# Altium footprint library Active.PcbLib: 325 footprints (part 12 of 23)
Each footprint in its own frame and in the unit in brackets; x right, y up, seen from the top. Pads: shape width x height; smd on the part's side, far side on the other; paste and mask are expansions set on the pad; w line width, h text height; cw(c..) or ccw(c..) is an arc to the next point about the centre after c.
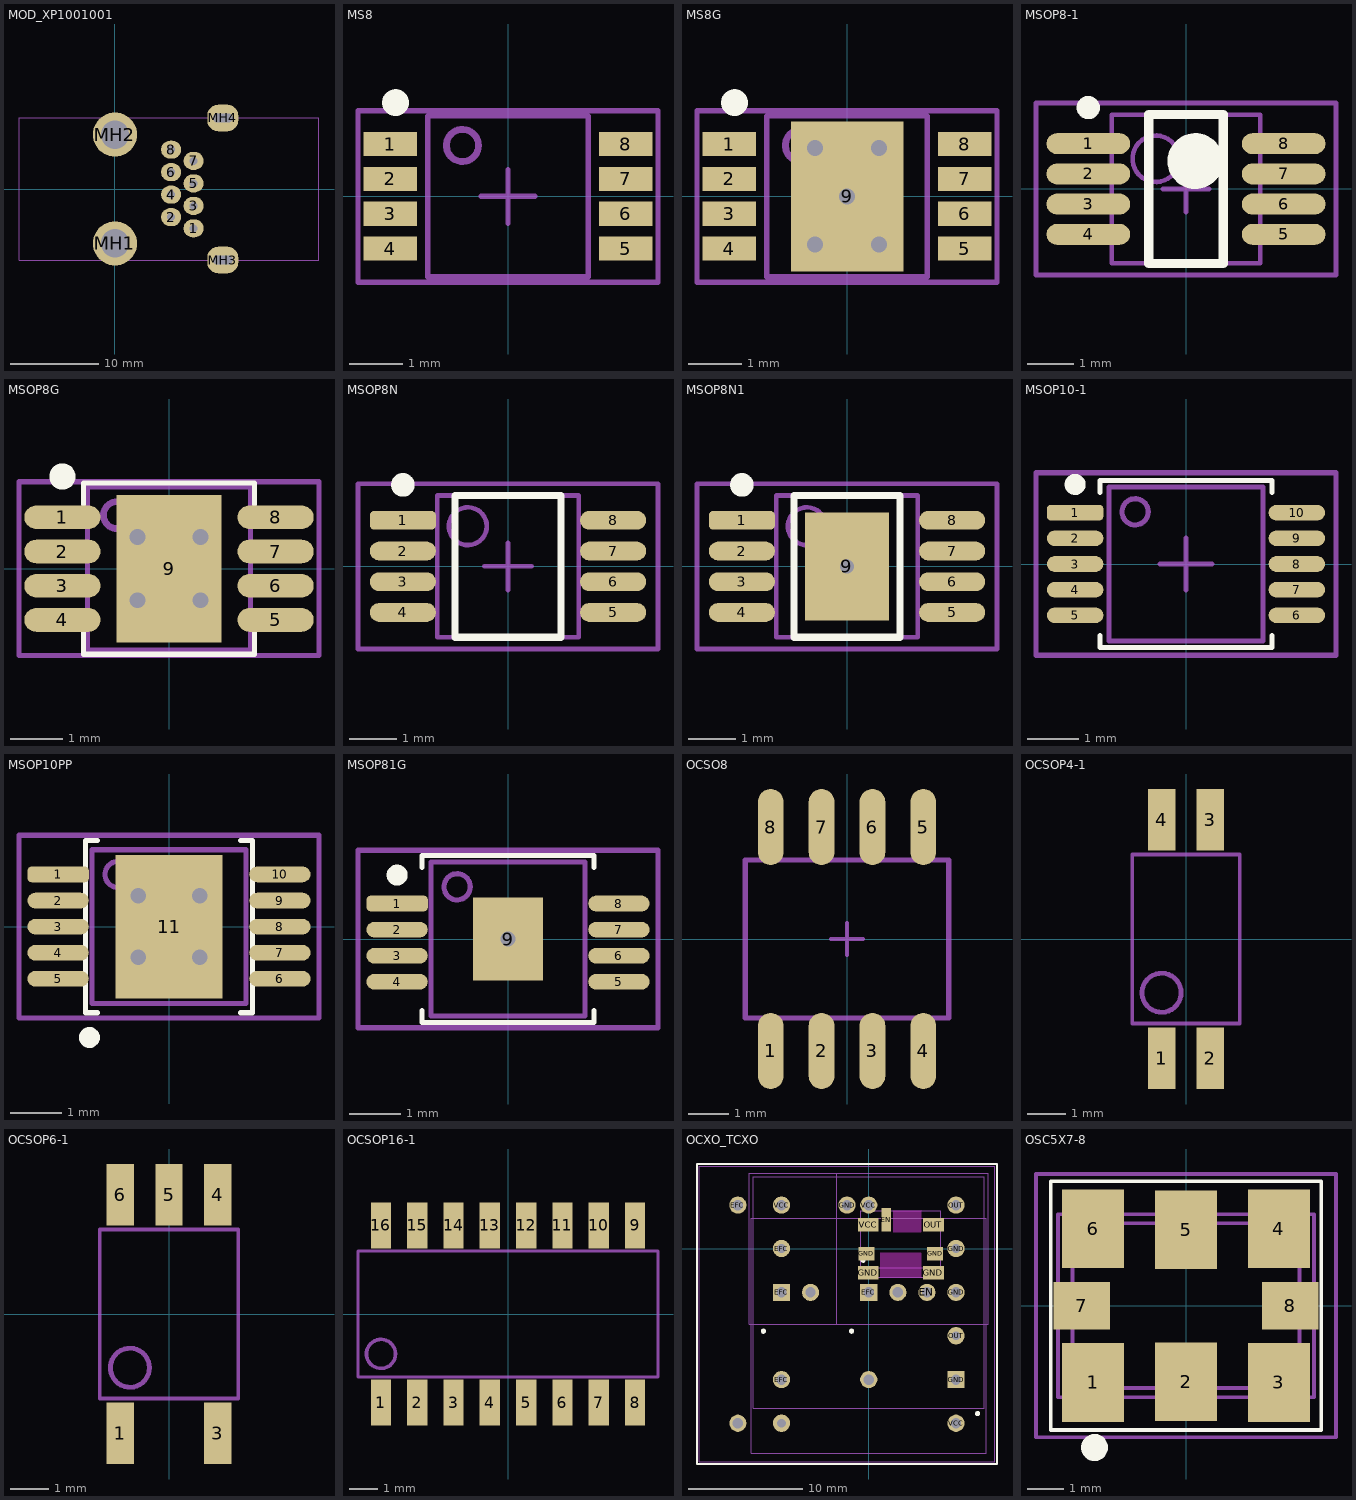
[diagram p11: the footprints below, top view; thin cyan lines are the x and y axes]

## MOD_XP1001001 [mil] "Ethernet controller module"
pads (12):
  oval 90x80 hole 35.43: 1(350,-175) 2(250,-125) 3(350,-75) 4(250,-25) 5(350,25) 6(250,75) 7(350,125) 8(250,175)
  round 196.85 hole 125.98: MH1(0,-242) MH2(0,242)
  rrect80% 137.8x118.11 hole 39.37 slot 86.61 at 0 deg: MH3(480,-316) MH4(480,316)
Mechanical 13:
  lines w4: -427,-316 -427,316 908,316 908,-316 -427,-316
3D body: height 644.43, standoff -152.87, extent -425.38,-421.29 956.02,415.33

## MS8 [mm] "MSOP 8pin 3,0x3,0mm R0,65mm High Density NO EP"
height 1.092
pads (8):
  rect 1x0.45 smd mask+0.051: 1(-2.2,0.975) 2(-2.2,0.325) 3(-2.2,-0.325) 4(-2.2,-0.975) 5(2.2,-0.975) 6(2.2,-0.325) 7(2.2,0.325) 8(2.2,0.975)
Top Overlay:
  circle w0.25: c-2.1,1.75 r0.125
Mechanical 13:
  circle w0.127: c-0.85,0.95 r0.3
  lines w0.1: -1.5,-1.5 1.5,-1.5 1.5,1.5 -1.5,1.5 -1.5,-1.5
Mechanical 15:
  lines w0.1: -0.5,0 0.5,0 ; 0,-0.5 0,0.5 ; -2.8,-1.6 2.8,-1.6 2.8,1.6 -2.8,1.6 -2.8,-1.6
3D body: height 1.12, standoff 1.09, extent -1.15,0.65 -0.55,1.25
3D body: height 1.09, standoff 0.1, extent -1.5,-1.5 1.5,1.5

## MS8G [mm] "MSOP 8pin 3,0x3,0mm R0,65mm High Density EP"
height 1.092
pads (9):
  rect 1x0.45 smd mask+0.04: 1(-2.2,0.975) 2(-2.2,0.325) 3(-2.2,-0.325) 4(-2.2,-0.975) 5(2.2,-0.975) 6(2.2,-0.325) 7(2.2,0.325) 8(2.2,0.975)
  rect 2.1x2.8 smd paste-5 mask-5: 9(0,0)
via -0.6,0.9 diameter 0.65 hole 0.3
via 0.6,0.9 diameter 0.65 hole 0.3
via 0.6,-0.9 diameter 0.65 hole 0.3
via -0.6,-0.9 diameter 0.65 hole 0.3
via 0,0 diameter 0.65 hole 0.3
Top Overlay:
  circle w0.25: c-2.1,1.75 r0.125
Top Paste:
  region: -1.05,1.05 -0.925,1.05 -0.75,1.225 -0.75,1.4 -1.05,1.4
  region: 1.05,1.05 0.925,1.05 0.75,1.225 0.75,1.4 1.05,1.4
  region: 1.05,-1.05 0.925,-1.05 0.75,-1.225 0.75,-1.4 1.05,-1.4
  region: -1.05,-1.05 -0.925,-1.05 -0.75,-1.225 -0.75,-1.4 -1.05,-1.4
  region: -0.45,-1.4 -0.45,-1.225 -0.3,-1.075 -0.3,-0.75 -0.15,-0.6 -0.15,-0.325 0.15,-0.325 0.15,-0.6 0.3,-0.725 0.3,-1.075 0.45,-1.225 0.45,-1.4
  region: -0.45,1.4 -0.45,1.225 -0.3,1.075 -0.3,0.75 -0.15,0.6 -0.15,0.325 0.15,0.325 0.15,0.6 0.3,0.725 0.3,1.075 0.45,1.225 0.45,1.4
  region: 1.05,0.575 0.45,0.575 0.325,0.45 0.325,-0.45 0.45,-0.575 1.05,-0.575
  region: -1.05,0.575 -0.45,0.575 -0.325,0.45 -0.325,-0.45 -0.45,-0.575 -1.05,-0.575
Top Solder:
  drawing of 4 lines, arcs and shapes, not listed
Mechanical 13:
  circle w0.127: c-0.85,0.95 r0.3
  lines w0.1: -1.5,-1.5 -1.5,1.5 1.5,1.5 1.5,-1.5 -1.5,-1.5
Mechanical 15:
  lines w0.1: -0.5,0 0.5,0 ; 0,-0.5 0,0.5 ; -2.8,-1.6 -2.8,1.6 2.8,1.6 2.8,-1.6 -2.8,-1.6
3D body: height 1.09, standoff 0.1, extent -1.5,-1.5 1.5,1.5
3D body: height 1.12, standoff 1.09, extent -1.15,0.65 -0.55,1.25

## MSOP8-1 [mm] "TSOP, 8-Leads, Body 3,2x3,2mm (max), Pitch 0,65mm, IPC Medium Density"
height 1.1
pads (8):
  oval 1.8x0.45 smd mask+0.051: 1(-2.1,0.975) 2(-2.1,0.325) 3(-2.1,-0.325) 4(-2.1,-0.975) 5(2.1,-0.975) 6(2.1,-0.325) 7(2.1,0.325) 8(2.1,0.975)
Top Overlay:
  circle w0.6: c0.2,0.6 r0.3
  circle w0.25: c-2.1,1.75 r0.125
  lines w0.2: -0.8,-1.6 0.8,-1.6 0.8,1.6 -0.8,1.6 -0.8,-1.6
Mechanical 13:
  circle w0.1: c-0.65,0.65 r0.5
  lines w0.1: -1.6,-1.6 1.6,-1.6 1.6,1.6 -1.6,1.6 -1.6,-1.6
Mechanical 15:
  lines w0.1: -0.5,0 0.5,0 ; 0,-0.5 0,0.5 ; -3.225,-1.85 3.225,-1.85 3.225,1.85 -3.225,1.85 -3.225,-1.85
3D body: height 1.11, standoff 1.1, extent -1.35,0.775 -0.952,1.174
3D body: height 1.1, standoff 0.15, extent -1.6,-1.6 1.6,1.6

## MSOP8G [mm] "TSOP, 8-Leads, Body 3,1x3,1mm (max), Pitch 0,65mm, IPC High Density"
height 1.1
pads (9):
  oval 1.45x0.45 smd mask+0.051: 1(-2.025,0.975) 2(-2.025,0.325) 3(-2.025,-0.325) 4(-2.025,-0.975) 5(2.025,-0.975) 6(2.025,-0.325) 7(2.025,0.325) 8(2.025,0.975)
  rect 2x2.8 smd paste-5 mask-5: 9(0,0)
via 0.6,-0.6 diameter 0.65 hole 0.3
via -0.6,-0.6 diameter 0.65 hole 0.3
via 0.6,0.6 diameter 0.65 hole 0.3
via -0.6,0.6 diameter 0.65 hole 0.3
Top Overlay:
  circle w0.25: c-2.025,1.75 r0.125
  lines w0.102: -1.625,-1.225 -1.625,-1.626 1.625,-1.626 1.625,-1.225 ; -1.625,1.225 -1.625,1.626 1.625,1.626 1.625,1.225
Top Paste:
  region: -0.45,0.275 -0.275,0.45 0.275,0.45 0.45,0.275 0.45,-0.275 0.275,-0.45 -0.275,-0.45 -0.45,-0.275
  region: -1,0.45 -0.925,0.45 -0.75,0.275 -0.75,-0.275 -0.925,-0.45 -1,-0.45
  region: -1,1.4 -0.75,1.4 -0.75,0.925 -0.925,0.75 -1,0.75
  region: -0.45,1.4 -0.45,0.925 -0.275,0.75 0.275,0.75 0.45,0.925 0.45,1.4
  region: -1,-1.4 -0.75,-1.4 -0.75,-0.925 -0.925,-0.75 -1,-0.75
  region: 1,-1.4 0.75,-1.4 0.75,-0.925 0.925,-0.75 1,-0.75
  region: 1,1.4 0.75,1.4 0.75,0.925 0.925,0.75 1,0.75
  region: 1,0.45 0.925,0.45 0.75,0.275 0.75,-0.275 0.925,-0.45 1,-0.45
  region: -0.45,-1.4 -0.45,-0.925 -0.275,-0.75 0.275,-0.75 0.45,-0.925 0.45,-1.4
Top Solder:
  drawing of 4 lines, arcs and shapes, not listed
Mechanical 13:
  circle w0.127: c-0.991,1.016 r0.255
  lines w0.1: -1.55,-1.55 1.55,-1.55 1.55,1.55 -1.55,1.55 -1.55,-1.55
Mechanical 15:
  lines w0.1: -0.5,0 0.5,0 ; 0,-0.5 0,0.5 ; -2.85,-1.65 2.85,-1.65 2.85,1.65 -2.85,1.65 -2.85,-1.65
3D body: height 1.1, standoff 0, extent -1.55,-1.55 1.55,1.55
3D body: height 1.12, standoff 1.1, extent -1.245,0.762 -0.735,1.27

## MSOP8N [mm]
height 1.1
pads (8):
  rrect50% 1.4x0.4 smd mask+0.051: 1(-2.225,0.975)
  oval 1.4x0.4 smd mask+0.051: 2(-2.225,0.325) 3(-2.225,-0.325) 4(-2.225,-0.975) 5(2.225,-0.975) 6(2.225,-0.325) 7(2.225,0.325) 8(2.225,0.975)
Top Overlay:
  circle w0.25: c-2.225,1.725 r0.125
  lines w0.15: -1.125,-1.5 -1.125,1.5 1.125,1.5 1.125,-1.5 -1.125,-1.5
Mechanical 13:
  circle w0.1: c-0.85,0.85 r0.4
  lines w0.1: -1.5,-1.5 -1.5,1.5 1.5,1.5 1.5,-1.5 -1.5,-1.5
Mechanical 15:
  lines w0.1: -0.5,0 0.5,0 ; 0,-0.5 0,0.5 ; -3.175,-1.75 -3.175,1.75 3.175,1.75 3.175,-1.75 -3.175,-1.75
3D body: height 1.11, standoff 1.1, extent -1.248,0.452 -0.452,1.25
3D body: height 1.1, standoff 0.15, extent -1.5,-1.5 1.5,1.5

## MSOP8N1 [mm]
height 1.1
pads (9):
  rrect50% 1.4x0.4 smd mask+0.051: 1(-2.225,0.975)
  oval 1.4x0.4 smd mask+0.051: 2(-2.225,0.325) 3(-2.225,-0.325) 4(-2.225,-0.975) 5(2.225,-0.975) 6(2.225,-0.325) 7(2.225,0.325) 8(2.225,0.975)
  rect 1.778x2.286 smd paste-2.54 mask-2.54: 9(0,0)
via 0,0 diameter 0.65 hole 0.3
Top Overlay:
  circle w0.25: c-2.225,1.725 r0.125
  lines w0.15: -1.125,-1.5 -1.125,1.5 1.125,1.5 1.125,-1.5 -1.125,-1.5
Top Solder:
  circle w0.1: c0,0 r0.419
  region: -0.432,0 -0.94,0 -0.94,1.194 0.94,1.194 0.94,-1.194 -0.94,-1.194 -0.94,0 -0.432,0 -0.432,-0.043 -0.407,-0.168 -0.311,-0.311 -0.168,-0.407 -0.043,-0.432 0,-0.432 0.041,-0.432 0.163,-0.407 0.302,-0.315 0.395,-0.176 0.419,-0.054 0.419,-0.013 0.419,0.013 0.419,0.054 0.395,0.176 0.302,0.315 0.163,0.407 0.041,0.432 0,0.432 -0.043,0.432 -0.168,0.407 -0.311,0.311 -0.407,0.168 -0.432,0.043
Mechanical 13:
  circle w0.1: c-0.85,0.85 r0.4
  lines w0.1: -1.5,-1.5 -1.5,1.5 1.5,1.5 1.5,-1.5 -1.5,-1.5
Mechanical 15:
  lines w0.1: -0.5,0 0.5,0 ; 0,-0.5 0,0.5 ; -3.175,-1.75 -3.175,1.75 3.175,1.75 3.175,-1.75 -3.175,-1.75
3D body: height 1.11, standoff 1.1, extent -1.248,0.452 -0.452,1.25
3D body: height 1.1, standoff 0.15, extent -1.5,-1.5 1.5,1.5

## MSOP10-1 [mil] "MSOP 10pin 3x3mm R0.5mm"
height 43
pads (10):
  rrect50% 43.31x12 smd mask+1.18: 1(-85,39.37)
  oval 43.31x12 smd mask+1.18: 2(-85,19.68) 3(-85,0) 4(-85,-19.68) 5(-85,-39.37) 6(85,-39.37) 7(85,-19.68) 8(85,0) 9(85,19.68) 10(85,39.37)
Top Overlay:
  circle w8: c-85,61 r4
  lines w4.02: -66,-55 -66,-64 66,-64 66,-55 ; -66,55 -66,64 66,64 66,55
Mechanical 13:
  circle w3.94: c-39,40 r10.05
  lines w4.02: -59,-59 59,-59 59,59 -59,59 -59,-59
Mechanical 15:
  lines w4.02: -20,0 20,0 ; 0,-20 0,20 ; -115,-70 -115,70 115,70 115,-70 -115,-70
3D body: height 43, standoff 3.94, extent -59,-59 59,59
3D body: height 43.31, standoff 43, extent -49.15,30 -29.15,50

## MSOP10PP [mil] "MSOP 10pin with power pad"
height 43
pads (11):
  rrect50% 47x12 smd mask+2: 1(-85,40)
  oval 47x12 smd mask+2: 2(-85,20) 3(-85,0) 4(-85,-20) 5(-85,-40) 6(85,-40) 7(85,-20) 8(85,0) 9(85,20) 10(85,40)
  rect 82.01x110 smd paste-196.85 mask-196.85: 11(0,0)
via -23.62,-23.62 diameter 25.59 hole 11.81
via 23.62,-23.62 diameter 25.59 hole 11.81
via -23.62,23.62 diameter 25.59 hole 11.81
via 23.62,23.62 diameter 25.59 hole 11.81
Top Overlay:
  circle w8: c-61,-85 r4
  lines w4.02: -55,-66 -64,-66 -64,66 -55,66 ; 55,-66 64,-66 64,66 55,66
Top Paste:
  region: -17.72,10.83 -10.83,17.72 10.83,17.72 17.72,10.83 17.72,-10.83 10.83,-17.72 -10.83,-17.72 -17.72,-10.83
  region: -40.35,17.72 -36.42,17.72 -29.53,10.83 -29.53,-10.83 -36.42,-17.72 -40.35,-17.72
  region: -40.35,54.13 -29.53,54.13 -29.53,36.42 -36.42,29.53 -40.35,29.53
  region: -40.35,-54.13 -29.53,-54.13 -29.53,-36.42 -36.42,-29.53 -40.35,-29.53
  region: 40.35,-54.13 29.53,-54.13 29.53,-36.42 36.42,-29.53 40.35,-29.53
  region: 40.35,54.13 29.53,54.13 29.53,36.42 36.42,29.53 40.35,29.53
  region: 40.35,17.72 36.42,17.72 29.53,10.83 29.53,-10.83 36.42,-17.72 40.35,-17.72
  region: -17.72,54.13 -17.72,36.42 -10.83,29.53 10.83,29.53 17.72,36.42 17.72,54.13
  region: -17.72,-54.13 -17.72,-36.42 -10.83,-29.53 10.83,-29.53 17.72,-36.42 17.72,-54.13
Top Solder:
  drawing of 4 lines, arcs and shapes, not listed
Mechanical 13:
  circle w3.94: c-39,40 r10.05
  lines w4.02: -59,-59 59,-59 59,59 -59,59 -59,-59
Mechanical 15:
  lines w4.02: -20,0 20,0 ; 0,-20 0,20 ; -115,-70 -115,70 115,70 115,-70 -115,-70
3D body: height 43, standoff 0, extent -59,-59 59,59
3D body: height 43.31, standoff 43, extent -49.15,30 -29.15,50

## MSOP81G [mil] "MSOP 8pin with power pad R0.5mm"
height 42.99
pads (9):
  rrect50% 47x12 smd mask+2: 1(-85,27.2)
  oval 47x12 smd mask+2: 2(-85,7.2) 3(-85,-12.8) 4(-85,-32.8)
  oval 47.01x12.01 smd mask+2: 5(85,-32.8) 6(85,-12.8) 7(85,7.2) 8(85,27.2)
  rect 54.02x64.02 smd paste-196.85 mask-196.85: 9(0,0)
via 0,0 diameter 25.59 hole 11.81
Top Overlay:
  circle w8: c-85,49 r4
  lines w4.02: -66,-55 -66,-64 66,-64 66,-55 ; -66,55 -66,64 66,64 66,55
Top Paste:
  region: -26.57,5.91 -12.8,5.91 -5.91,12.8 5.91,12.8 12.8,5.91 26.57,5.91 26.57,31.5 -26.57,31.5
  region: -26.57,-5.91 -12.8,-5.91 -5.91,-12.8 5.91,-12.8 12.8,-5.91 26.57,-5.91 26.57,-31.5 -26.57,-31.5
Top Solder:
  region: -28.54,33.46 0,33.46 0,12.8 -1.26,12.8 -4.99,12.05 -9.22,9.22 -12.05,4.99 -12.8,1.26 -12.8,0 -12.8,-1.26 -12.05,-4.99 -9.22,-9.22 -4.99,-12.05 -1.26,-12.8 0,-12.8 1.26,-12.8 4.99,-12.05 9.22,-9.22 12.05,-4.99 12.8,-1.26 12.8,0 12.8,1.26 12.05,4.99 9.22,9.22 4.99,12.05 1.26,12.8 0,12.8 0,33.46 28.54,33.46 28.54,-33.46 -28.54,-33.46
Mechanical 13:
  circle w3.94: c-39,40 r10.05
  lines w4.02: -59,-59 -59,59 59,59 59,-59 -59,-59
Mechanical 15:
  lines w4.02: -20.32,0 19.68,0 ; 0,-20 0,20 ; -115,-68 115,-68 115,68 -115,68 -115,-68
3D body: height 43, standoff 0, extent -59,-59 59,59

## OCSO8 [mm] "Optocoupler SO8 8pin"
height 3.2
pads (8):
  oval 0.64x1.9 smd: 1(-1.905,-2.795) 2(-0.635,-2.795) 3(0.635,-2.795) 4(1.905,-2.795) 5(1.905,2.795) 6(0.635,2.795) 7(-0.635,2.795) 8(-1.905,2.795)
Mechanical 13:
  lines w0.127: -2.54,-1.968 2.54,-1.968 2.54,1.968 -2.54,1.968 -2.54,-1.968
Mechanical 15:
  lines w0.102: -0.4,0 0.4,0 ; 0,-0.4 0,0.4
3D body: height 3.17, standoff 0, extent -2.54,-1.968 2.54,1.968
3D body: height 3.18, standoff 3.17, extent -2.3,-1.4 -1.5,-0.6
3D body: height 3.18, standoff 3.17, extent -2.54,-1.968 2.54,-1.7
3D body: height 1, standoff 0, extent 1.71,-3.3 2.11,-1.968
3D body: height 1, standoff 0, extent 0.44,-3.3 0.84,-1.968
3D body: height 1, standoff 0, extent -0.83,-3.3 -0.43,-1.968
3D body: height 1, standoff 0, extent -2.1,-3.3 -1.7,-1.968
3D body: height 1, standoff 0, extent 1.71,1.968 2.11,3.3
3D body: height 1, standoff 0, extent 0.44,1.968 0.84,3.3
3D body: height 1, standoff 0, extent -0.83,1.968 -0.43,3.3
3D body: height 1, standoff 0, extent -2.1,1.968 -1.7,3.3

## OCSOP4-1 [mm] "SOP 4pin  Optocoupler R1.27mm  10.5x4.4mm"
height 2.1
pads (4):
  rect 0.711x1.6 smd: 1(-0.635,-3.1) 2(0.635,-3.1) 3(0.635,3.1) 4(-0.635,3.1)
Mechanical 13:
  circle w0.127: c-0.635,-1.397 r0.508
  lines w0.102: -1.397,-2.2 1.397,-2.2 1.397,2.2 -1.397,2.2 -1.397,-2.2
3D body: height 2.15, standoff 2, extent -1.143,-1.905 -0.127,-0.889
3D body: height 2.1, standoff 0.1, extent -1.44,-2.2 1.397,2.2
3D body: height 1.05, standoff 0.9, extent -0.889,-3.048 -0.381,-2.2
3D body: height 0.15, standoff 0, extent -0.889,-3.556 -0.381,-2.921
3D body: height 1.05, standoff 0, extent -0.889,-3.048 -0.381,-2.921
3D body: height 1.05, standoff 0, extent 0.381,-3.048 0.889,-2.921
3D body: height 0.15, standoff 0, extent 0.381,-3.556 0.889,-2.921
3D body: height 1.05, standoff 0.9, extent 0.381,-3.048 0.889,-2.2
3D body: height 1.05, standoff 0.9, extent -0.889,2.2 -0.381,3.048
3D body: height 0.15, standoff 0, extent -0.889,2.921 -0.381,3.556
3D body: height 1.05, standoff 0, extent -0.889,2.921 -0.381,3.048
3D body: height 1.05, standoff 0.9, extent 0.381,2.2 0.889,3.048
3D body: height 0.15, standoff 0, extent 0.381,2.921 0.889,3.556
3D body: height 1.05, standoff 0, extent 0.381,2.921 0.889,3.048

## OCSOP6-1 [mm] "SOP 6pin  Optocoupler R1.27mm  10.5x4.4mm"
height 2.1
pads (5):
  rect 0.711x1.6 smd: 1(-1.27,-3.1) 3(1.27,-3.1) 4(1.27,3.1) 5(0,3.1) 6(-1.27,3.1)
Mechanical 13:
  circle w0.127: c-1.016,-1.397 r0.508
  lines w0.102: -1.8,-2.2 1.8,-2.2 1.8,2.2 -1.8,2.2 -1.8,-2.2
3D body: height 2.61, standoff 2, extent -1.524,-1.905 -0.508,-0.889
3D body: height 2.6, standoff 0.1, extent -1.8,-2.2 1.8,2.2
3D body: height 1.05, standoff 0.9, extent -1.524,-3.048 -1.016,-2.2
3D body: height 0.15, standoff 0, extent -1.524,-3.556 -1.016,-2.921
3D body: height 1.05, standoff 0, extent -1.524,-3.048 -1.016,-2.921
3D body: height 1.05, standoff 0, extent 1.016,-3.048 1.524,-2.921
3D body: height 0.15, standoff 0, extent 1.016,-3.556 1.524,-2.921
3D body: height 1.05, standoff 0.9, extent 1.016,-3.048 1.524,-2.2
3D body: height 1.05, standoff 0.9, extent -0.254,2.2 0.254,3.048
3D body: height 0.15, standoff 0, extent -0.254,2.921 0.254,3.556
3D body: height 1.05, standoff 0, extent -0.254,2.921 0.254,3.048
3D body: height 1.05, standoff 0.9, extent 1.016,2.2 1.524,3.048
3D body: height 0.15, standoff 0, extent 1.016,2.921 1.524,3.556
3D body: height 1.05, standoff 0, extent 1.016,2.921 1.524,3.048
3D body: height 1.05, standoff 0, extent -1.524,2.921 -1.016,3.048
3D body: height 0.15, standoff 0, extent -1.524,2.921 -1.016,3.556
3D body: height 1.05, standoff 0.9, extent -1.524,2.2 -1.016,3.048

## OCSOP16-1 [mm] "SOP 16pin  Optocoupler R1.27mm  10.5x4.4mm"
height 2.1
pads (16):
  rect 0.711x1.6 smd: 1(-4.445,-3.1) 2(-3.175,-3.1) 3(-1.905,-3.1) 4(-0.635,-3.1) 5(0.635,-3.1) 6(1.905,-3.1) 7(3.175,-3.1) 8(4.445,-3.1) 9(4.445,3.1) 10(3.175,3.1) 11(1.905,3.1) 12(0.635,3.1) 13(-0.635,3.1) 14(-1.905,3.1) 15(-3.175,3.1) 16(-4.445,3.1)
Mechanical 13:
  circle w0.127: c-4.445,-1.397 r0.508
  lines w0.102: -5.25,-2.2 5.25,-2.2 5.25,2.2 -5.25,2.2 -5.25,-2.2
3D body: height 2.15, standoff 2, extent -4.953,-1.905 -3.937,-0.889
3D body: height 2.1, standoff 0.1, extent -5.25,-2.2 5.25,2.2
3D body: height 1.05, standoff 0.9, extent -4.699,-3.048 -4.191,-2.2
3D body: height 0.15, standoff 0, extent -4.699,-3.556 -4.191,-2.921
3D body: height 1.05, standoff 0, extent -4.699,-3.048 -4.191,-2.921
3D body: height 1.05, standoff 0, extent -3.429,-3.048 -2.921,-2.921
3D body: height 0.15, standoff 0, extent -3.429,-3.556 -2.921,-2.921
3D body: height 1.05, standoff 0.9, extent -3.429,-3.048 -2.921,-2.2
3D body: height 1.05, standoff 0.9, extent -4.699,2.2 -4.191,3.048
3D body: height 0.15, standoff 0, extent -4.699,2.921 -4.191,3.556
3D body: height 1.05, standoff 0, extent -4.699,2.921 -4.191,3.048
3D body: height 1.05, standoff 0.9, extent -3.429,2.2 -2.921,3.048
3D body: height 0.15, standoff 0, extent -3.429,2.921 -2.921,3.556
3D body: height 1.05, standoff 0, extent -3.429,2.921 -2.921,3.048
3D body: height 1.05, standoff 0, extent -0.889,2.921 -0.381,3.048
3D body: height 0.15, standoff 0, extent -0.889,2.921 -0.381,3.556
3D body: height 1.05, standoff 0.9, extent -0.889,2.2 -0.381,3.048
3D body: height 1.05, standoff 0, extent -2.159,2.921 -1.651,3.048
3D body: height 0.15, standoff 0, extent -2.159,2.921 -1.651,3.556
3D body: height 1.05, standoff 0.9, extent -2.159,2.2 -1.651,3.048
3D body: height 1.05, standoff 0.9, extent -0.889,-3.048 -0.381,-2.2
3D body: height 0.15, standoff 0, extent -0.889,-3.556 -0.381,-2.921
3D body: height 1.05, standoff 0, extent -0.889,-3.048 -0.381,-2.921
3D body: height 1.05, standoff 0, extent -2.159,-3.048 -1.651,-2.921
3D body: height 0.15, standoff 0, extent -2.159,-3.556 -1.651,-2.921
3D body: height 1.05, standoff 0.9, extent -2.159,-3.048 -1.651,-2.2
3D body: height 1.05, standoff 0, extent 1.651,2.921 2.159,3.048
3D body: height 0.15, standoff 0, extent 1.651,2.921 2.159,3.556
3D body: height 1.05, standoff 0.9, extent 1.651,2.2 2.159,3.048
3D body: height 1.05, standoff 0, extent 0.381,2.921 0.889,3.048
3D body: height 0.15, standoff 0, extent 0.381,2.921 0.889,3.556
3D body: height 1.05, standoff 0.9, extent 0.381,2.2 0.889,3.048
3D body: height 1.05, standoff 0.9, extent 1.651,-3.048 2.159,-2.2
3D body: height 0.15, standoff 0, extent 1.651,-3.556 2.159,-2.921
3D body: height 1.05, standoff 0, extent 1.651,-3.048 2.159,-2.921
3D body: height 1.05, standoff 0, extent 0.381,-3.048 0.889,-2.921
3D body: height 0.15, standoff 0, extent 0.381,-3.556 0.889,-2.921
3D body: height 1.05, standoff 0.9, extent 0.381,-3.048 0.889,-2.2
3D body: height 1.05, standoff 0, extent 4.191,2.921 4.699,3.048
3D body: height 0.15, standoff 0, extent 4.191,2.921 4.699,3.556
3D body: height 1.05, standoff 0.9, extent 4.191,2.2 4.699,3.048
3D body: height 1.05, standoff 0, extent 2.921,2.921 3.429,3.048
3D body: height 0.15, standoff 0, extent 2.921,2.921 3.429,3.556
3D body: height 1.05, standoff 0.9, extent 2.921,2.2 3.429,3.048
3D body: height 1.05, standoff 0.9, extent 4.191,-3.048 4.699,-2.2
3D body: height 0.15, standoff 0, extent 4.191,-3.556 4.699,-2.921
3D body: height 1.05, standoff 0, extent 4.191,-3.048 4.699,-2.921
3D body: height 1.05, standoff 0, extent 2.921,-3.048 3.429,-2.921
3D body: height 0.15, standoff 0, extent 2.921,-3.556 3.429,-2.921
3D body: height 1.05, standoff 0.9, extent 2.921,-3.048 3.429,-2.2

## OCXO_TCXO [mm] "Grouped OCXO and TCXO footprint"
pads (27):
  round 1.5 hole 0.9: EFC(-11.43,3.81) EFC(-7.62,-11.43) EN(5.08,-3.81) GND(-1.9,3.81) GND(7.62,-3.81) OUT(7.62,3.81) VCC(-7.62,3.81) VCC(0,3.81) VCC(7.62,-15.24) VREF(-11.43,-15.24) VREF(-5.08,-3.81) VREF(0,-11.43) VREF(2.54,-3.81)
  rect 1.5x1.5 hole 0.9: EFC(-7.62,-3.81) EFC(0,-3.81) GND(7.62,-11.43)
  round 1.524 hole 0.762: EFC(-7.62,0.02) GND(7.62,0.02) OUT(7.62,-7.6) VREF(-7.62,-15.24)
  rect 0.8x2.04 smd: EN(1.53,2.52)
  rect 1.4x1.2 smd: GND(-0.2,-0.44) GND(5.8,-0.44)
  rect 1.8x1.2 smd: GND(-0.05,-2.1) GND(5.65,-2.1) OUT(5.65,2.1) VCC(-0.05,2.1)
Top Overlay:
  circle w0.254: c9.5,-14.4 r0.1
  circle w0.254: c-9.2,-7.2 r0.1
  circle w0.254: c-1.5,-7.2 r0.1
  circle w0.254: c-0.5,-1 r0.1
  lines w0.15: -15,-18.8 11.2,-18.8 11.2,7.4 -15,7.4 -15,-18.8
Keep-Out Layer:
  rectangle: 1,-2.5 4.6,-0.35
  rectangle: 2.1,1.4 4.6,3.33
Mechanical 13:
  lines w0.1: -10.42,6.6 -10.42,-6.61 -2.8,-6.61 ; -10.42,6.61 -2.8,6.61 10.42,6.61 10.42,-6.61 -2.8,-6.61 ; -2.8,6.6 -2.8,-6.61 ; -0.7,-1.67 6.3,-1.67 ; -14.81,-18.62 -14.81,7.19 11,7.19 11,-18.62 -14.81,-18.62 ; -10.25,-17.85 -10.25,2.65 10.25,2.65 10.25,-17.85 -10.25,-17.85 ; -10.1,-13.91 -10.1,6.29 10.1,6.29 10.1,-13.91 -10.1,-13.91 ; -0.7,-2.5 6.3,-2.5 6.3,3.33 -0.7,3.33 -0.7,-2.5
3D body: height 13, standoff 0.02, extent -14.8,-18.6 11,7.2

## OSC5X7-8 [mm] "Crystal oscillator 5x7x1.65mm 8pin"
height 1.65
pads (8):
  rect 1.7x2.15 smd mask+0.102: 1(-2.54,-2.1) 2(0,-2.075) 3(2.54,-2.1) 4(2.54,2.1) 5(0,2.075) 6(-2.54,2.1)
  rect 1.545x1.3 smd mask+0.102: 7(-2.852,0) 8(2.852,0)
Top Overlay:
  circle w0.381: c-2.5,-3.878 r0.178
  lines w0.102: -3.7,-3.4 3.7,-3.4 3.7,3.4 -3.7,3.4 -3.7,-3.4
Mechanical 13:
  circle w0.381: c-2.3,-1.5 r0.178
  lines w0.102: -3.5,-2.5 -3.5,2.5 3.5,2.5 3.5,-2.5 -3.5,-2.5 ; -3.1,-2 ccw(c-2.85,-2) -2.85,-2.25 2.85,-2.25 ccw(c2.85,-2) 3.1,-2 3.1,2 ccw(c2.85,2) 2.85,2.25 -2.85,2.25 ccw(c-2.85,2) -3.1,2 -3.1,-2
Mechanical 15:
  lines w0.102: -4.1,-3.6 -4.1,3.6 4.1,3.6 4.1,-3.6 -4.1,-3.6
3D body: height 1.67, standoff 1.65, extent -2.6,-1.8 -2,-1.2
3D body: height 1.3, standoff 0, extent -3.5,-2.5 3.5,2.5
3D body: height 1.65, standoff 1.3, extent -3.096,-2.258 3.1,2.258